# Altium schematic symbol library MCU_ST_STM32L4.SchLib: 319 symbols (part 8 of 8)
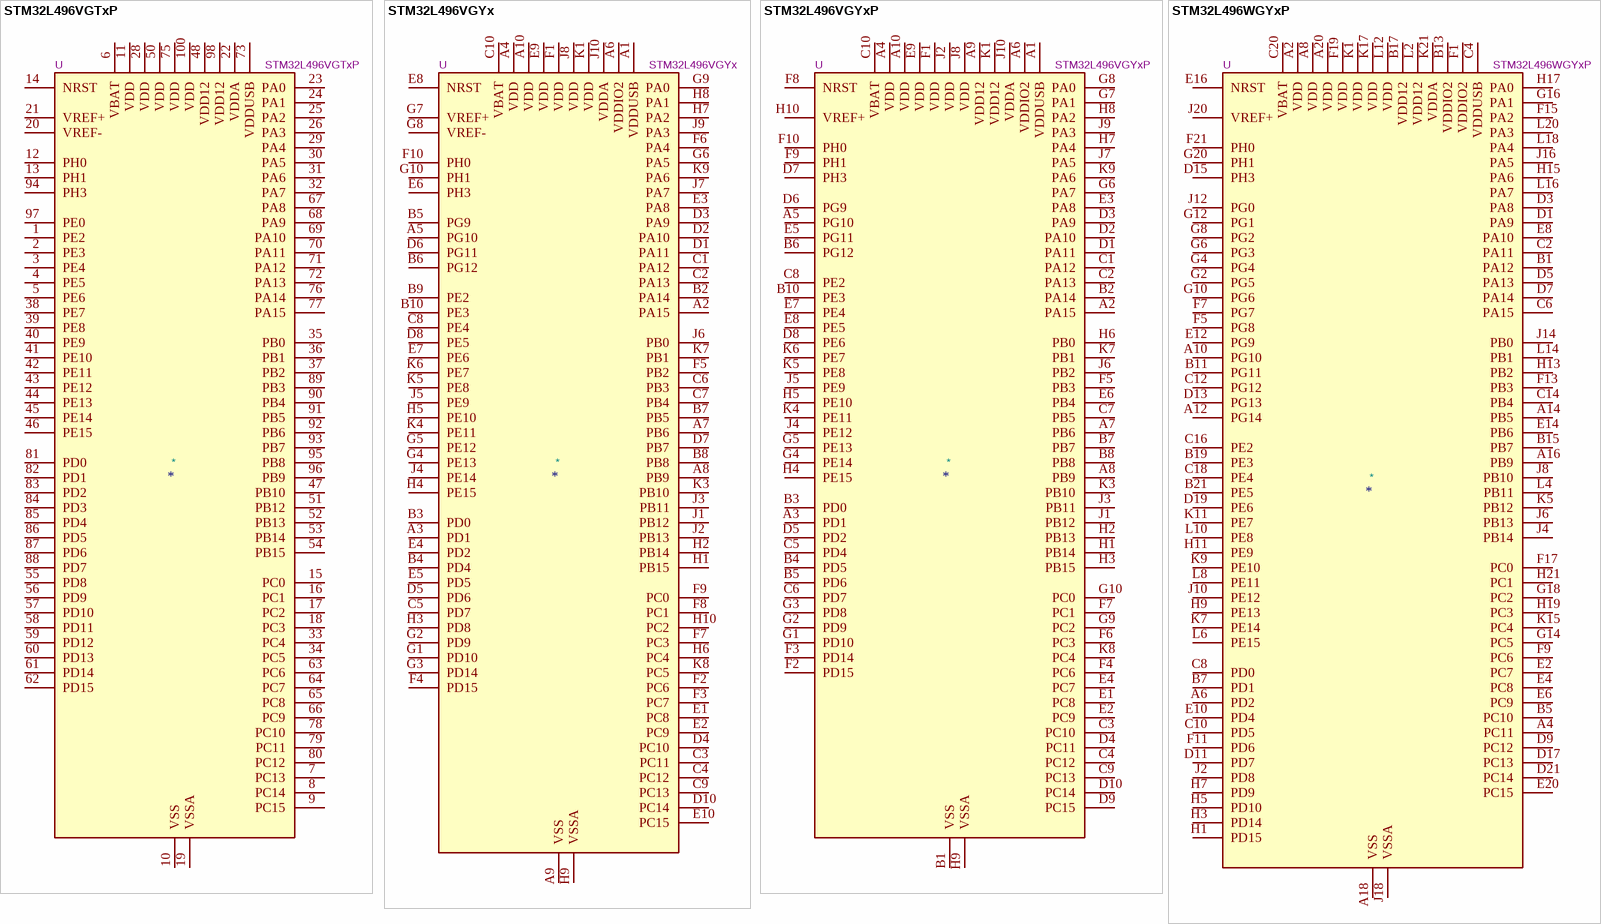
[diagram p68: symbols STM32L496VGTxP to STM32L496WGYxP]

## STM32L496VGTxP
designator *  value STM32L496VGTxP  Reference: U
ki_keywords: Arm Cortex-M4 STM32L4 STM32L4x6; ki_description: STMicroelectronics Arm Cortex-M4 MCU, 1024KB flash, 320KB RAM, 80 MHz, 1.71-3.6V, 81 GPIO, LQFP100; ki_fp_filters: LQFP*14x14mm*P0.5mm*; Footprint: Package_QFP:LQFP-100_14x14mm_P0.5mm; Datasheet: https://www.st.com/resource/en/datasheet/stm32l496vg.pdf
pins: 1 PE2, 2 PE3, 3 PE4, 4 PE5, 5 PE6, 6 VBAT, 7 PC13, 8 PC14, 9 PC15, 10 VSS, 11 VDD, 12 PH0, 13 PH1, 14 NRST, 15 PC0, 16 PC1, 17 PC2, 18 PC3, 19 VSSA, 20 VREF-, 21 VREF+, 22 VDDA, 23 PA0, 24 PA1, 25 PA2, 26 PA3, 27 VSS hidden, 28 VDD, 29 PA4, 30 PA5, 31 PA6, 32 PA7, 33 PC4, 34 PC5, 35 PB0, 36 PB1, 37 PB2, 38 PE7, 39 PE8, 40 PE9, 41 PE10, 42 PE11, 43 PE12, 44 PE13, 45 PE14, 46 PE15, 47 PB10, 48 VDD12, 49 VSS hidden, 50 VDD, 51 PB12, 52 PB13, 53 PB14, 54 PB15, 55 PD8, 56 PD9, 57 PD10, 58 PD11, 59 PD12, 60 PD13, 61 PD14, 62 PD15, 63 PC6, 64 PC7, 65 PC8, 66 PC9, 67 PA8, 68 PA9, 69 PA10, 70 PA11, 71 PA12, 72 PA13, 73 VDDUSB, 74 VSS hidden, 75 VDD, 76 PA14, 77 PA15, 78 PC10, 79 PC11, 80 PC12, 81 PD0, 82 PD1, 83 PD2, 84 PD3, 85 PD4, 86 PD5, 87 PD6, 88 PD7, 89 PB3, 90 PB4, 91 PB5, 92 PB6, 93 PB7, 94 PH3, 95 PB8, 96 PB9, 97 PE0, 98 VDD12, 99 VSS hidden, 100 VDD

## STM32L496VGYx
designator *  value STM32L496VGYx  Reference: U
ki_keywords: Arm Cortex-M4 STM32L4 STM32L4x6; ki_description: STMicroelectronics Arm Cortex-M4 MCU, 1024KB flash, 320KB RAM, 80 MHz, 1.71-3.6V, 81 GPIO, WLCSP100; ki_fp_filters: ST*WLCSP*Die461*; Footprint: Package_CSP:ST_WLCSP-100_Die461; Datasheet: https://www.st.com/resource/en/datasheet/stm32l496vg.pdf
pins: A1 VDDUSB, A2 PA15, A3 PD1, A4 VDD, A5 PG10, A6 VDDIO2, A7 PB6, A8 PB9, A9 VSS, A10 VDD, B1 VSS hidden, B2 PA14, B3 PD0, B4 PD4, B5 PG9, B6 PG12, B7 PB5, B8 PB8, B9 PE2, B10 PE3, C1 PA12, C2 PA13, C3 PC11, C4 PC12, C5 PD7, C6 PB3, C7 PB4, C8 PE4, C9 PC13, C10 VBAT, D1 PA11, D2 PA10, D3 PA9, D4 PC10, D5 PD6, D6 PG11, D7 PB7, D8 PE5, D9 VSS hidden, D10 PC14, E1 PC8, E2 PC9, E3 PA8, E4 PD2, E5 PD5, E6 PH3, E7 PE6, E8 NRST, E9 VDD, E10 PC15, F1 VDD, F2 PC6, F3 PC7, F4 PD15, F5 PB2, F6 PA4, F7 PC3, F8 PC1, F9 PC0, F10 PH0, G1 PD10, G2 PD9, G3 PD14, G4 PE13, G5 PE12, G6 PA5, G7 VREF+, G8 VREF-, G9 PA0, G10 PH1, H1 PB15, H2 PB14, H3 PD8, H4 PE15, H5 PE10, H6 PC4, H7 PA2, H8 PA1, H9 VSSA, H10 PC2, J1 PB12, J2 PB13, J3 PB11, J4 PE14, J5 PE9, J6 PB0, J7 PA7, J8 VDD, J9 PA3, J10 VDDA, K1 VDD, K2 VSS hidden, K3 PB10, K4 PE11, K5 PE8, K6 PE7, K7 PB1, K8 PC5, K9 PA6, K10 VSS hidden

## STM32L496VGYxP
designator *  value STM32L496VGYxP  Reference: U
ki_keywords: Arm Cortex-M4 STM32L4 STM32L4x6; ki_description: STMicroelectronics Arm Cortex-M4 MCU, 1024KB flash, 320KB RAM, 80 MHz, 1.71-3.6V, 80 GPIO, WLCSP100; ki_fp_filters: ST*WLCSP*Die461*; Footprint: Package_CSP:ST_WLCSP-100_Die461; Datasheet: https://www.st.com/resource/en/datasheet/stm32l496vg.pdf
pins: A1 VDDUSB, A2 PA15, A3 PD1, A4 VDD, A5 PG10, A6 VDDIO2, A7 PB6, A8 PB9, A9 VDD12, A10 VDD, B1 VSS, B2 PA14, B3 PD0, B4 PD5, B5 PD6, B6 PG12, B7 PB7, B8 PB8, B9 VSS hidden, B10 PE3, C1 PA12, C2 PA13, C3 PC10, C4 PC12, C5 PD4, C6 PD7, C7 PB5, C8 PE2, C9 PC13, C10 VBAT, D1 PA11, D2 PA10, D3 PA9, D4 PC11, D5 PD2, D6 PG9, D7 PH3, D8 PE6, D9 PC15, D10 PC14, E1 PC8, E2 PC9, E3 PA8, E4 PC7, E5 PG11, E6 PB4, E7 PE4, E8 PE5, E9 VDD, E10 VSS hidden, F1 VDD, F2 PD15, F3 PD14, F4 PC6, F5 PB3, F6 PC3, F7 PC1, F8 NRST, F9 PH1, F10 PH0, G1 PD10, G2 PD9, G3 PD8, G4 PE14, G5 PE13, G6 PA7, G7 PA1, G8 PA0, G9 PC2, G10 PC0, H1 PB14, H2 PB13, H3 PB15, H4 PE15, H5 PE10, H6 PB0, H7 PA4, H8 PA2, H9 VSSA, H10 VREF+, J1 PB12, J2 VDD, J3 PB11, J4 PE12, J5 PE9, J6 PB2, J7 PA5, J8 VDD, J9 PA3, J10 VDDA, K1 VDD12, K2 VSS hidden, K3 PB10, K4 PE11, K5 PE8, K6 PE7, K7 PB1, K8 PC4, K9 PA6, K10 VSS hidden

## STM32L496WGYxP
designator *  value STM32L496WGYxP  Reference: U
ki_keywords: Arm Cortex-M4 STM32L4 STM32L4x6; ki_description: STMicroelectronics Arm Cortex-M4 MCU, 1024KB flash, 320KB RAM, 80 MHz, 1.71-3.6V, 90 GPIO, WLCSP115; Footprint: Package_CSP:ST_WLCSP-115_4.63x4.15mm_P0.4mm_Stagger; Datasheet: https://www.st.com/resource/en/datasheet/stm32l496wg.pdf; ki_fp_filters: *
pins: A2 VDD, A4 PC11, A6 PD2, A8 VDD, A10 PG10, A12 PG14, A14 PB5, A16 PB9, A18 VSS, A20 VDD, B1 PA12, B3 VSS hidden, B5 PC10, B7 PD1, B9 VSS hidden, B11 PG11, B13 VDDIO2, B15 PB7, B17 VDD12, B19 PE3, B21 PE5, C2 PA11, C4 VDDUSB, C6 PA15, C8 PD0, C10 PD5, C12 PG12, C14 PB4, C16 PE2, C18 PE4, C20 VBAT, D1 PA9, D3 PA8, D5 PA13, D7 PA14, D9 PC12, D11 PD7, D13 PG13, D15 PH3, D17 PC13, D19 PE6, D21 PC14, E2 PC7, E4 PC8, E6 PC9, E8 PA10, E10 PD4, E12 PG9, E14 PB6, E16 NRST, E18 VSS hidden, E20 PC15, F1 VDDIO2, F3 VSS hidden, F5 PG8, F7 PG7, F9 PC6, F11 PD6, F13 PB3, F15 PA2, F17 PC0, F19 VDD, F21 PH0, G2 PG5, G4 PG4, G6 PG3, G8 PG2, G10 PG6, G12 PG1, G14 PC5, G16 PA1, G18 PC2, G20 PH1, H1 PD15, H3 PD14, H5 PD10, H7 PD9, H9 PE13, H11 PE9, H13 PB2, H15 PA6, H17 PA0, H19 PC3, H21 PC1, J2 PD8, J4 PB14, J6 PB13, J8 PB10, J10 PE12, J12 PG0, J14 PB0, J16 PA5, J18 VSSA, J20 VREF+, K1 VDD, K3 VSS hidden, K5 PB12, K7 PE14, K9 PE10, K11 PE7, K13 VSS hidden, K15 PC4, K17 VDD, K19 VSS hidden, K21 VDDA, L2 VDD12, L4 PB11, L6 PE15, L8 PE11, L10 PE8, L12 VDD, L14 PB1, L16 PA7, L18 PA4, L20 PA3

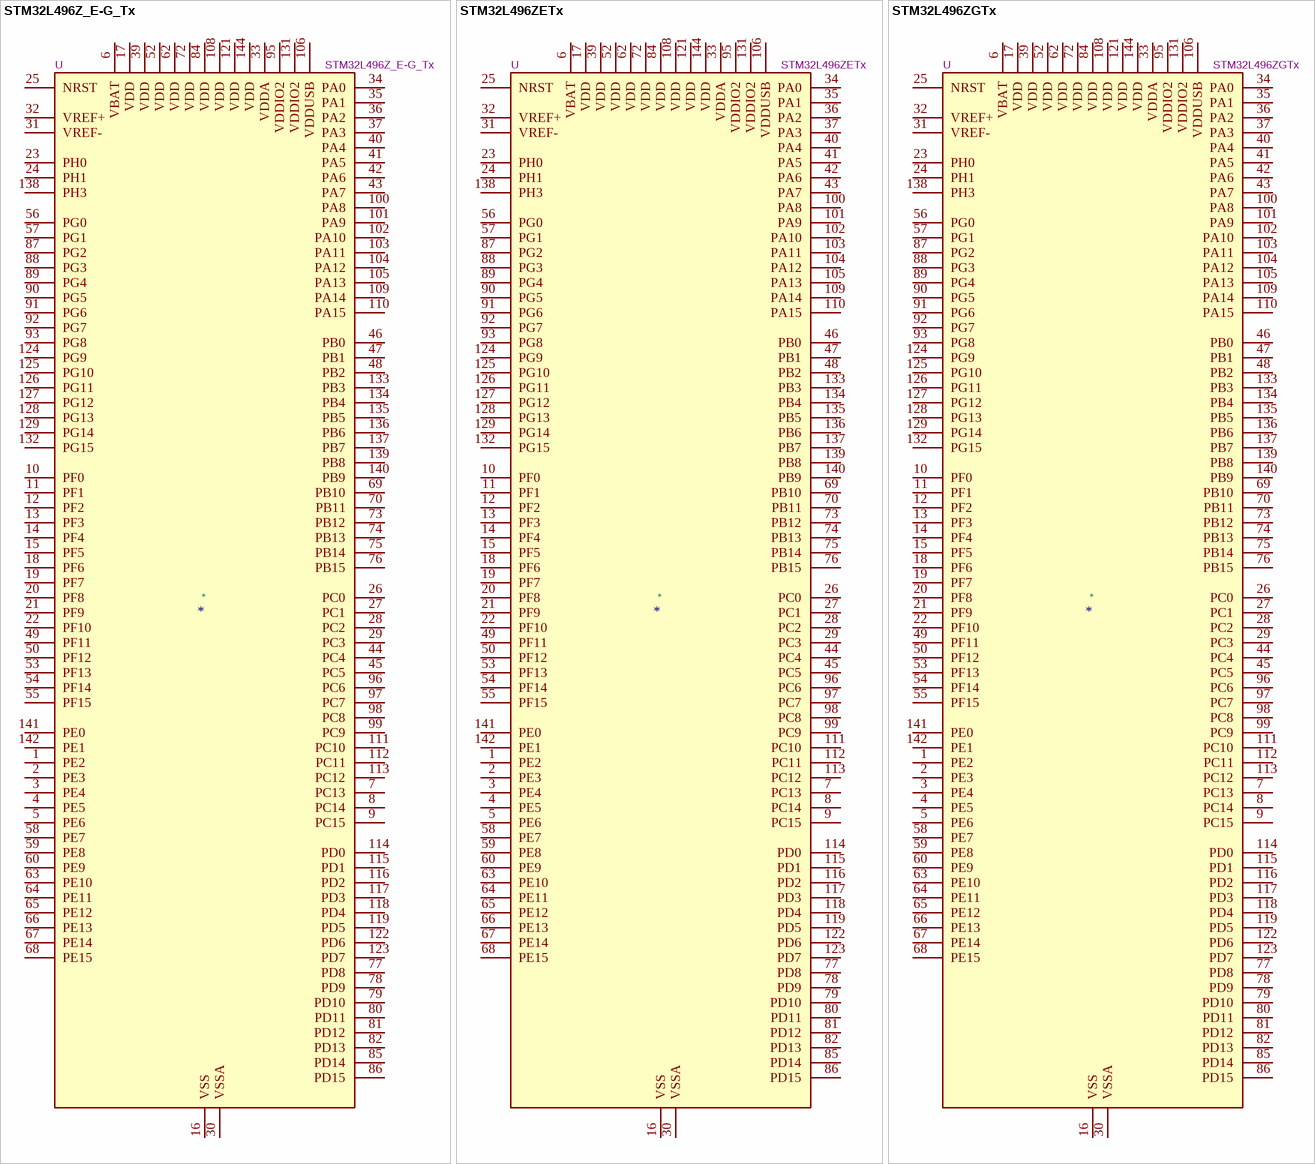
[diagram p60: symbols STM32L496Z_E-G_Tx to STM32L496ZGTx]

## STM32L496Z_E-G_Tx
designator *  value STM32L496Z_E-G_Tx  Reference: U
ki_keywords: Arm Cortex-M4 STM32L4 STM32L4x6; ki_description: STMicroelectronics Arm Cortex-M4 MCU, 512-1024KB flash, 320KB RAM, 80 MHz, 1.71-3.6V, 115 GPIO, LQFP144; ki_fp_filters: LQFP*20x20mm*P0.5mm*; Footprint: Package_QFP:LQFP-144_20x20mm_P0.5mm; Datasheet: https://www.st.com/resource/en/datasheet/stm32l496ze.pdf
pins: 1 PE2, 2 PE3, 3 PE4, 4 PE5, 5 PE6, 6 VBAT, 7 PC13, 8 PC14, 9 PC15, 10 PF0, 11 PF1, 12 PF2, 13 PF3, 14 PF4, 15 PF5, 16 VSS, 17 VDD, 18 PF6, 19 PF7, 20 PF8, 21 PF9, 22 PF10, 23 PH0, 24 PH1, 25 NRST, 26 PC0, 27 PC1, 28 PC2, 29 PC3, 30 VSSA, 31 VREF-, 32 VREF+, 33 VDDA, 34 PA0, 35 PA1, 36 PA2, 37 PA3, 38 VSS hidden, 39 VDD, 40 PA4, 41 PA5, 42 PA6, 43 PA7, 44 PC4, 45 PC5, 46 PB0, 47 PB1, 48 PB2, 49 PF11, 50 PF12, 51 VSS hidden, 52 VDD, 53 PF13, 54 PF14, 55 PF15, 56 PG0, 57 PG1, 58 PE7, 59 PE8, 60 PE9, 61 VSS hidden, 62 VDD, 63 PE10, 64 PE11, 65 PE12, 66 PE13, 67 PE14, 68 PE15, 69 PB10, 70 PB11, 71 VSS hidden, 72 VDD, 73 PB12, 74 PB13, 75 PB14, 76 PB15, 77 PD8, 78 PD9, 79 PD10, 80 PD11, 81 PD12, 82 PD13, 83 VSS hidden, 84 VDD, 85 PD14, 86 PD15, 87 PG2, 88 PG3, 89 PG4, 90 PG5, 91 PG6, 92 PG7, 93 PG8, 94 VSS hidden, 95 VDDIO2, 96 PC6, 97 PC7, 98 PC8, 99 PC9, 100 PA8, 101 PA9, 102 PA10, 103 PA11, 104 PA12, 105 PA13, 106 VDDUSB, 107 VSS hidden, 108 VDD, 109 PA14, 110 PA15, 111 PC10, 112 PC11, 113 PC12, 114 PD0, 115 PD1, 116 PD2, 117 PD3, 118 PD4, 119 PD5, 120 VSS hidden, 121 VDD, 122 PD6, 123 PD7, 124 PG9, 125 PG10, 126 PG11, 127 PG12, 128 PG13, 129 PG14, 130 VSS hidden, 131 VDDIO2, 132 PG15, 133 PB3, 134 PB4, 135 PB5, 136 PB6, 137 PB7, 138 PH3, 139 PB8, 140 PB9, 141 PE0, 142 PE1, 143 VSS hidden, 144 VDD

## STM32L496ZETx
designator *  value STM32L496ZETx  Reference: U
ki_keywords: Arm Cortex-M4 STM32L4 STM32L4x6; ki_description: STMicroelectronics Arm Cortex-M4 MCU, 512KB flash, 320KB RAM, 80 MHz, 1.71-3.6V, 115 GPIO, LQFP144; ki_fp_filters: LQFP*20x20mm*P0.5mm*; Footprint: Package_QFP:LQFP-144_20x20mm_P0.5mm; Datasheet: https://www.st.com/resource/en/datasheet/stm32l496ze.pdf
pins: 1 PE2, 2 PE3, 3 PE4, 4 PE5, 5 PE6, 6 VBAT, 7 PC13, 8 PC14, 9 PC15, 10 PF0, 11 PF1, 12 PF2, 13 PF3, 14 PF4, 15 PF5, 16 VSS, 17 VDD, 18 PF6, 19 PF7, 20 PF8, 21 PF9, 22 PF10, 23 PH0, 24 PH1, 25 NRST, 26 PC0, 27 PC1, 28 PC2, 29 PC3, 30 VSSA, 31 VREF-, 32 VREF+, 33 VDDA, 34 PA0, 35 PA1, 36 PA2, 37 PA3, 38 VSS hidden, 39 VDD, 40 PA4, 41 PA5, 42 PA6, 43 PA7, 44 PC4, 45 PC5, 46 PB0, 47 PB1, 48 PB2, 49 PF11, 50 PF12, 51 VSS hidden, 52 VDD, 53 PF13, 54 PF14, 55 PF15, 56 PG0, 57 PG1, 58 PE7, 59 PE8, 60 PE9, 61 VSS hidden, 62 VDD, 63 PE10, 64 PE11, 65 PE12, 66 PE13, 67 PE14, 68 PE15, 69 PB10, 70 PB11, 71 VSS hidden, 72 VDD, 73 PB12, 74 PB13, 75 PB14, 76 PB15, 77 PD8, 78 PD9, 79 PD10, 80 PD11, 81 PD12, 82 PD13, 83 VSS hidden, 84 VDD, 85 PD14, 86 PD15, 87 PG2, 88 PG3, 89 PG4, 90 PG5, 91 PG6, 92 PG7, 93 PG8, 94 VSS hidden, 95 VDDIO2, 96 PC6, 97 PC7, 98 PC8, 99 PC9, 100 PA8, 101 PA9, 102 PA10, 103 PA11, 104 PA12, 105 PA13, 106 VDDUSB, 107 VSS hidden, 108 VDD, 109 PA14, 110 PA15, 111 PC10, 112 PC11, 113 PC12, 114 PD0, 115 PD1, 116 PD2, 117 PD3, 118 PD4, 119 PD5, 120 VSS hidden, 121 VDD, 122 PD6, 123 PD7, 124 PG9, 125 PG10, 126 PG11, 127 PG12, 128 PG13, 129 PG14, 130 VSS hidden, 131 VDDIO2, 132 PG15, 133 PB3, 134 PB4, 135 PB5, 136 PB6, 137 PB7, 138 PH3, 139 PB8, 140 PB9, 141 PE0, 142 PE1, 143 VSS hidden, 144 VDD

## STM32L496ZGTx
designator *  value STM32L496ZGTx  Reference: U
ki_keywords: Arm Cortex-M4 STM32L4 STM32L4x6; ki_description: STMicroelectronics Arm Cortex-M4 MCU, 1024KB flash, 320KB RAM, 80 MHz, 1.71-3.6V, 115 GPIO, LQFP144; ki_fp_filters: LQFP*20x20mm*P0.5mm*; Footprint: Package_QFP:LQFP-144_20x20mm_P0.5mm; Datasheet: https://www.st.com/resource/en/datasheet/stm32l496zg.pdf
pins: 1 PE2, 2 PE3, 3 PE4, 4 PE5, 5 PE6, 6 VBAT, 7 PC13, 8 PC14, 9 PC15, 10 PF0, 11 PF1, 12 PF2, 13 PF3, 14 PF4, 15 PF5, 16 VSS, 17 VDD, 18 PF6, 19 PF7, 20 PF8, 21 PF9, 22 PF10, 23 PH0, 24 PH1, 25 NRST, 26 PC0, 27 PC1, 28 PC2, 29 PC3, 30 VSSA, 31 VREF-, 32 VREF+, 33 VDDA, 34 PA0, 35 PA1, 36 PA2, 37 PA3, 38 VSS hidden, 39 VDD, 40 PA4, 41 PA5, 42 PA6, 43 PA7, 44 PC4, 45 PC5, 46 PB0, 47 PB1, 48 PB2, 49 PF11, 50 PF12, 51 VSS hidden, 52 VDD, 53 PF13, 54 PF14, 55 PF15, 56 PG0, 57 PG1, 58 PE7, 59 PE8, 60 PE9, 61 VSS hidden, 62 VDD, 63 PE10, 64 PE11, 65 PE12, 66 PE13, 67 PE14, 68 PE15, 69 PB10, 70 PB11, 71 VSS hidden, 72 VDD, 73 PB12, 74 PB13, 75 PB14, 76 PB15, 77 PD8, 78 PD9, 79 PD10, 80 PD11, 81 PD12, 82 PD13, 83 VSS hidden, 84 VDD, 85 PD14, 86 PD15, 87 PG2, 88 PG3, 89 PG4, 90 PG5, 91 PG6, 92 PG7, 93 PG8, 94 VSS hidden, 95 VDDIO2, 96 PC6, 97 PC7, 98 PC8, 99 PC9, 100 PA8, 101 PA9, 102 PA10, 103 PA11, 104 PA12, 105 PA13, 106 VDDUSB, 107 VSS hidden, 108 VDD, 109 PA14, 110 PA15, 111 PC10, 112 PC11, 113 PC12, 114 PD0, 115 PD1, 116 PD2, 117 PD3, 118 PD4, 119 PD5, 120 VSS hidden, 121 VDD, 122 PD6, 123 PD7, 124 PG9, 125 PG10, 126 PG11, 127 PG12, 128 PG13, 129 PG14, 130 VSS hidden, 131 VDDIO2, 132 PG15, 133 PB3, 134 PB4, 135 PB5, 136 PB6, 137 PB7, 138 PH3, 139 PB8, 140 PB9, 141 PE0, 142 PE1, 143 VSS hidden, 144 VDD

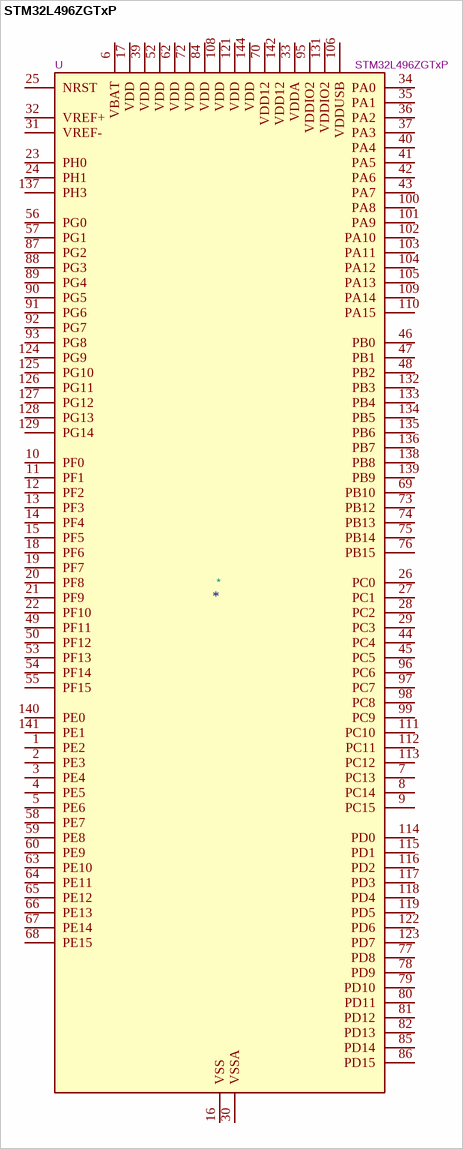
[diagram p61: symbol STM32L496ZGTxP]

## STM32L496ZGTxP
designator *  value STM32L496ZGTxP  Reference: U
ki_keywords: Arm Cortex-M4 STM32L4 STM32L4x6; ki_description: STMicroelectronics Arm Cortex-M4 MCU, 1024KB flash, 320KB RAM, 80 MHz, 1.71-3.6V, 113 GPIO, LQFP144; ki_fp_filters: LQFP*20x20mm*P0.5mm*; Footprint: Package_QFP:LQFP-144_20x20mm_P0.5mm; Datasheet: https://www.st.com/resource/en/datasheet/stm32l496zg.pdf
pins: 1 PE2, 2 PE3, 3 PE4, 4 PE5, 5 PE6, 6 VBAT, 7 PC13, 8 PC14, 9 PC15, 10 PF0, 11 PF1, 12 PF2, 13 PF3, 14 PF4, 15 PF5, 16 VSS, 17 VDD, 18 PF6, 19 PF7, 20 PF8, 21 PF9, 22 PF10, 23 PH0, 24 PH1, 25 NRST, 26 PC0, 27 PC1, 28 PC2, 29 PC3, 30 VSSA, 31 VREF-, 32 VREF+, 33 VDDA, 34 PA0, 35 PA1, 36 PA2, 37 PA3, 38 VSS hidden, 39 VDD, 40 PA4, 41 PA5, 42 PA6, 43 PA7, 44 PC4, 45 PC5, 46 PB0, 47 PB1, 48 PB2, 49 PF11, 50 PF12, 51 VSS hidden, 52 VDD, 53 PF13, 54 PF14, 55 PF15, 56 PG0, 57 PG1, 58 PE7, 59 PE8, 60 PE9, 61 VSS hidden, 62 VDD, 63 PE10, 64 PE11, 65 PE12, 66 PE13, 67 PE14, 68 PE15, 69 PB10, 70 VDD12, 71 VSS hidden, 72 VDD, 73 PB12, 74 PB13, 75 PB14, 76 PB15, 77 PD8, 78 PD9, 79 PD10, 80 PD11, 81 PD12, 82 PD13, 83 VSS hidden, 84 VDD, 85 PD14, 86 PD15, 87 PG2, 88 PG3, 89 PG4, 90 PG5, 91 PG6, 92 PG7, 93 PG8, 94 VSS hidden, 95 VDDIO2, 96 PC6, 97 PC7, 98 PC8, 99 PC9, 100 PA8, 101 PA9, 102 PA10, 103 PA11, 104 PA12, 105 PA13, 106 VDDUSB, 107 VSS hidden, 108 VDD, 109 PA14, 110 PA15, 111 PC10, 112 PC11, 113 PC12, 114 PD0, 115 PD1, 116 PD2, 117 PD3, 118 PD4, 119 PD5, 120 VSS hidden, 121 VDD, 122 PD6, 123 PD7, 124 PG9, 125 PG10, 126 PG11, 127 PG12, 128 PG13, 129 PG14, 130 VSS hidden, 131 VDDIO2, 132 PB3, 133 PB4, 134 PB5, 135 PB6, 136 PB7, 137 PH3, 138 PB8, 139 PB9, 140 PE0, 141 PE1, 142 VDD12, 143 VSS hidden, 144 VDD